# Altium footprint library HamedLib.PcbLib: 221 footprints (part 5 of 14)
Each footprint in its own frame and in the unit in brackets; x right, y up, seen from the top. Pads: shape width x height; smd on the part's side, far side on the other; paste and mask are expansions set on the pad; w line width, h text height; cw(c..) or ccw(c..) is an arc to the next point about the centre after c.
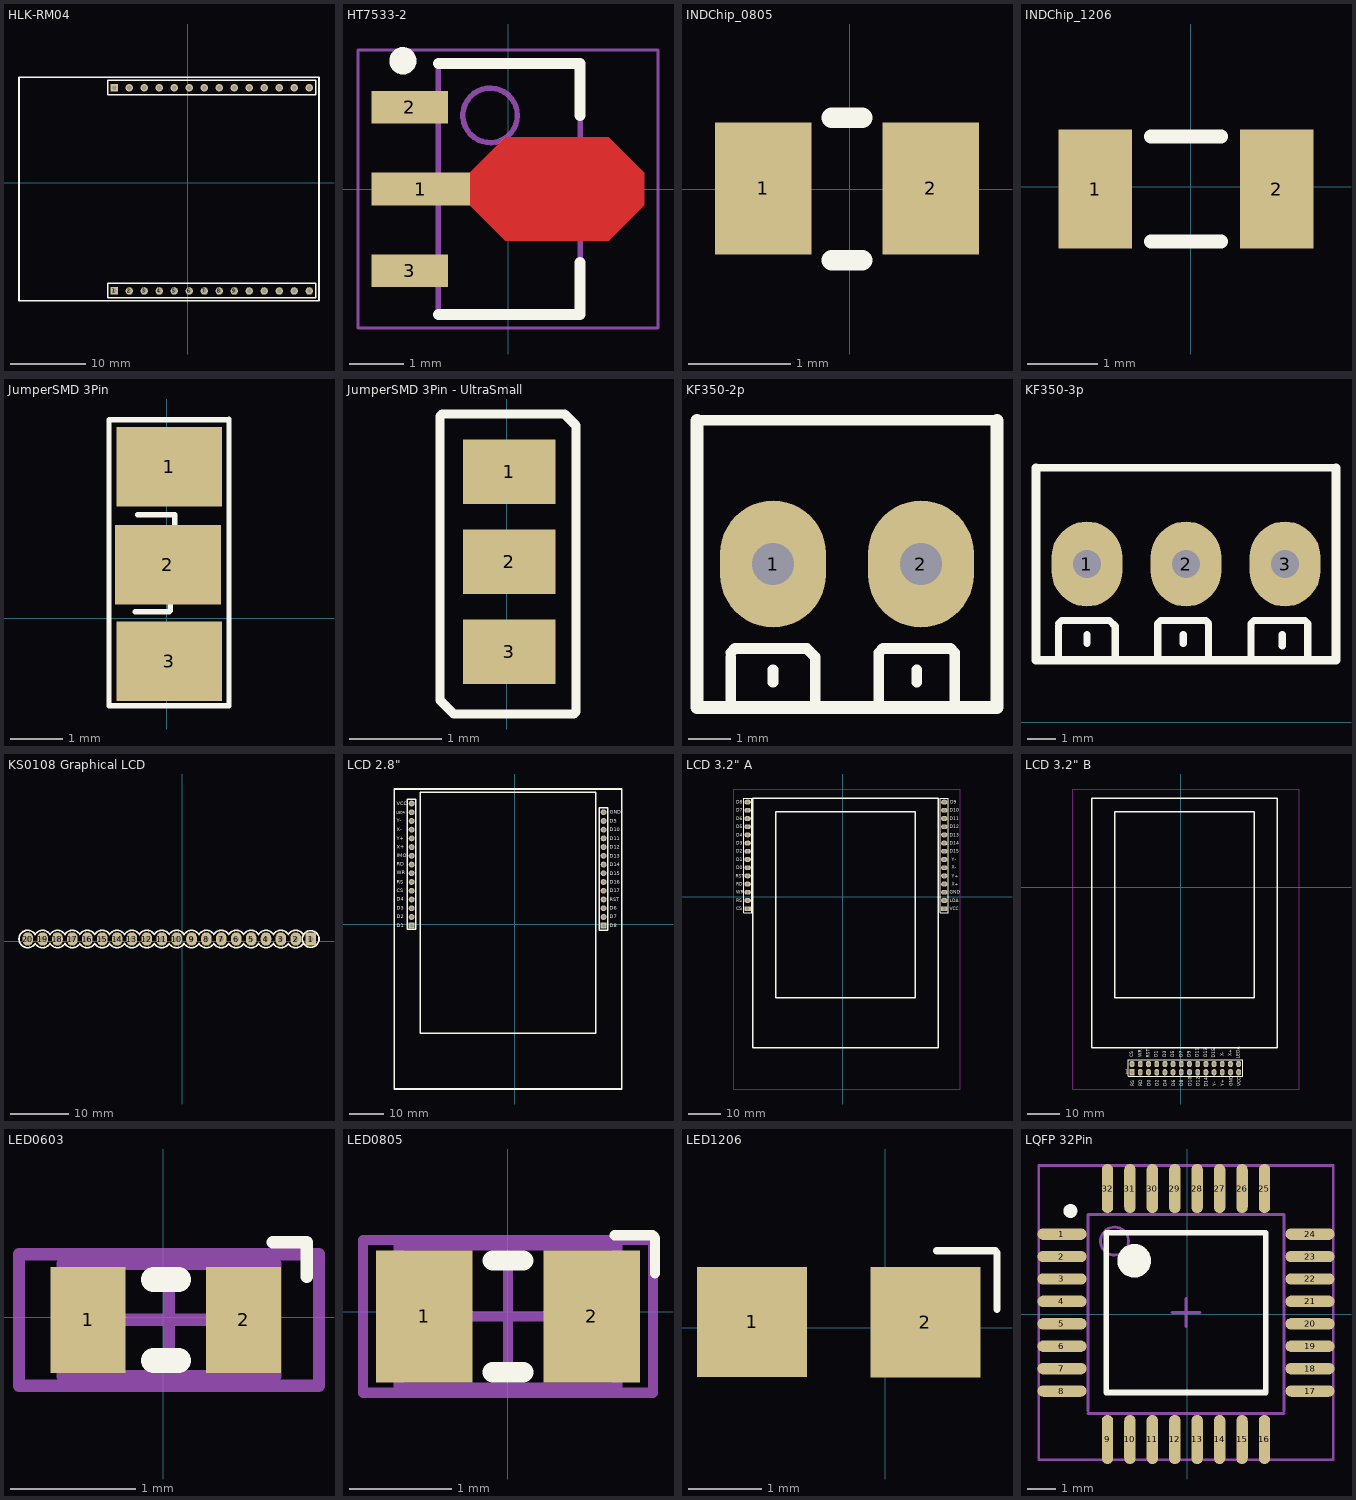
[diagram p4: the footprints below, top view; thin cyan lines are the x and y axes]

## HLK-RM04 [mm]
pads (28):
  rect 1x1 hole 0.6: 1(-9.827,-14.412) 28(-9.827,12.688)
  round 1 hole 0.6: 2(-7.827,-14.412) 3(-5.827,-14.412) 4(-3.827,-14.412) 5(-1.827,-14.412) 6(0.173,-14.412) 7(2.173,-14.412) 8(4.173,-14.412) 9(6.173,-14.412) 10(8.173,-14.412) 11(10.173,-14.412) 12(12.173,-14.412) 13(14.173,-14.412) 14(16.173,-14.412) 15(16.173,12.688) 16(14.173,12.688) 17(12.173,12.688) 18(10.173,12.688) 19(8.173,12.688) 20(6.173,12.688) 21(4.173,12.688) 22(2.173,12.688) 23(0.173,12.688) 24(-1.827,12.688) 25(-3.827,12.688) 26(-5.827,12.688) 27(-7.827,12.688)
Top Overlay:
  lines w0.2: -10.727,-15.312 -10.727,-13.412 17.073,-13.412 17.073,-15.312 -10.727,-15.312 ; -10.727,11.788 17.073,11.788 17.073,13.688 -10.727,13.688 -10.727,11.788
  lines w0.254: -22.527,-15.712 17.473,-15.712 17.473,14.088 -22.527,14.088 -22.527,-15.712
3D body "HLK RM04.STEP": height 5.5, standoff -5, extent -22.727,-15.512 17.273,13.788

## HT7533-2 [mm] "SOT89, 3-Leads, Body 4.49x2.45mm, Pitch 1.50mm, Lead Span 4.1mm, IPC Medium Density"
height 1.6
pads (3):
  rect 1.8x0.6 smd: 1(-1.6,0)
  rect 1.4x0.6 smd: 2(-1.8,1.5) 3(-1.8,-1.5)
Top Layer:
  region: -0.7,0.3 -0.05,0.95 1.85,0.95 2.5,0.3 2.5,-0.3 1.85,-0.95 -0.05,-0.95 -0.7,-0.3
Top Overlay:
  circle w0.25: c-1.927,2.35 r0.125
  lines w0.2: -1.278,-2.3 1.322,-2.3 1.322,-1.35 ; -1.278,2.3 1.322,2.3 1.322,1.35
Mechanical 13:
  circle w0.1: c-0.327,1.35 r0.5
  lines w0.1: -1.278,-2.3 1.322,-2.3 1.322,2.3 -1.278,2.3 -1.278,-2.3
Mechanical 15:
  lines w0.05: -2.75,-2.55 2.75,-2.55 2.75,2.55 -2.75,2.55 -2.75,-2.55
  lines w0.1: -0.477,0 0.523,0 ; 0.022,-0.5 0.022,0.5
3D body "HT7533-2.step": height 1.6, standoff 0, extent -2.2,-2.3 1.85,2.3

## INDChip_0805 [mm]
pads (2):
  rect 0.95x1.3 smd: 1(-0.852,0.005) 2(0.798,0.005)
Top Overlay:
  lines w0.2: -0.175,-0.7 0.125,-0.7 ; -0.175,0.7 0.125,0.7
3D body "User Library-ind_0805.step": height 0.95, standoff 0, extent -0.975,-0.625 1.025,0.575

## INDChip_1206 [mm]
pads (2):
  rect 1.05x1.7 smd: 1(-1.369,-0.03) 2(1.227,-0.03)
Top Overlay:
  lines w0.2: -0.571,-0.78 0.429,-0.78 ; -0.571,0.72 0.429,0.72
3D body "User Library-V1206HD.STEP": height 1.5, standoff 0, extent -1.725,-0.8 1.475,0.8

## JumperSMD 3Pin [mm]
pads (3):
  rect 2x1.5 smd: 1(0.051,2.87) 2(0.025,1.016) 3(0.051,-0.813)
Top Overlay:
  lines w0.1: -1.09,3.76 1.18,3.76 ; -1.09,3.765 -1.09,-1.655 1.18,-1.655 ; -0.625,-0.145 0.08,-0.145 0.08,-0.52 ; -0.6,0.125 0.05,0.125 0.07,0.145 0.07,0.525 ; -0.55,1.96 0.155,1.96 0.155,1.585 ; -0.525,2.23 0.125,2.23 0.145,2.25 0.145,2.63 ; 1.18,-1.635 1.18,3.77

## JumperSMD 3Pin - UltraSmall [mm]
pads (3):
  rect 1x0.7 smd: 1(0.025,2.875) 2(0.025,1.9) 3(0.025,0.925)
Top Overlay:
  lines w0.1: -0.725,0.4 -0.575,0.25 0.725,0.25 0.75,0.275 0.75,3.375 0.625,3.5 -0.7,3.5 -0.725,3.475 -0.725,0.4

## KF350-2p [mm] "-"
pads (2):
  oval 2.5x3 hole 1: 1(-10.1,5.6) 2(-6.6,5.6)
Top Overlay:
  lines w0.254: -11.9,9 -4.8,9 ; -11.1,2.2 -11.1,3.4 ; -11.1,3.5 -11,3.6 -9.3,3.6 -9.1,3.4 -9.1,2.3 ; -10.1,2.8 -10.1,3.1 ; -7.6,2.3 -7.6,3.5 -7.5,3.6 -5.9,3.6 -5.8,3.5 -5.8,2.2 ; -6.7,2.8 -6.7,3.1
  lines w0.305: -11.9,9 -11.9,2.2 -4.8,2.2 -4.8,9
3D body "User Library-KF350-2P.STEP": height 8.8, standoff -2.6, extent -11.9,2.1 -4.9,9

## KF350-3p [mm] "-"
pads (3):
  oval 2.5x3 hole 1: 1(-10.1,5.6) 2(-6.6,5.6) 3(-3.1,5.6)
Top Overlay:
  lines w0.254: -11.9,9 -1.3,9 ; -11.1,2.2 -11.1,3.4 ; -11.1,3.5 -11,3.6 -9.3,3.6 -9.1,3.4 -9.1,2.3 ; -10.1,2.8 -10.1,3.1 ; -7.6,2.3 -7.6,3.5 -7.5,3.6 -5.9,3.6 -5.8,3.5 -5.8,2.2 ; -6.7,2.8 -6.7,3.1 ; -4.3,2.3 -4.3,3.5 -4.2,3.6 -2.4,3.6 -2.3,3.5 -2.3,2.2 ; -3.2,2.7 -3.2,3.1
  lines w0.305: -11.9,9 -11.9,2.2 -1.3,2.2 -1.3,9
3D body "User Library-KF350-3P.STEP": height 8.8, standoff -2.6, extent -11.9,2.1 -1.4,9

## KS0108 Graphical LCD [mm] "-"
pads (20):
  rect 1.8x2.3 hole 0.9: 1(21.885,0.42)
  oval 1.8x2.3 hole 0.9: 2(19.345,0.42) 3(16.805,0.42) 4(14.265,0.42) 5(11.725,0.42) 6(9.185,0.42) 7(6.645,0.42) 8(4.105,0.42) 9(1.565,0.42) 10(-0.975,0.42) 11(-3.515,0.42) 12(-6.055,0.42) 13(-8.595,0.42) 14(-11.135,0.42) 15(-13.675,0.42) 16(-16.215,0.42) 17(-18.755,0.42) 18(-21.295,0.42) 19(-23.835,0.42) 20(-26.375,0.42)
Top Overlay:
  circle w0.3: c21.885,0.42 r1.42
  lines w0.3: -25.119,1.205 ccw(c-26.375,0.42) -25.105,-0.342 ccw(c-23.835,0.42) -22.565,-0.342 ccw(c-21.295,0.42) -20.025,-0.342 ccw(c-18.755,0.42) -17.485,-0.342 ccw(c-16.215,0.42) -14.945,-0.342 ccw(c-13.675,0.42) -12.405,-0.342 ccw(c-11.135,0.42) -9.865,-0.342 ccw(c-8.595,0.42) -7.325,-0.342 ccw(c-6.055,0.42) -4.785,-0.342 ccw(c-3.515,0.42) -2.245,-0.342 ccw(c-0.975,0.42) 0.295,-0.342 ccw(c1.565,0.42) 2.835,-0.342 ccw(c4.105,0.42) 5.375,-0.342 ccw(c6.645,0.42) 7.915,-0.342 ccw(c9.185,0.42) 10.455,-0.342 ccw(c11.725,0.42) 12.995,-0.342 ccw(c14.265,0.42) 15.535,-0.342 ccw(c16.805,0.42) 18.075,-0.342 ccw(c19.345,0.42) 20.615,-0.342 ; -25.105,1.182 cw(c-23.835,0.42) -22.565,1.182 cw(c-21.295,0.42) -20.025,1.182 cw(c-18.755,0.42) -17.485,1.182 cw(c-16.215,0.42) -14.945,1.182 cw(c-13.675,0.42) -12.405,1.182 cw(c-11.135,0.42) -9.865,1.182 cw(c-8.595,0.42) -7.325,1.182 cw(c-6.055,0.42) -4.785,1.182 cw(c-3.515,0.42) -2.245,1.182 cw(c-0.975,0.42) 0.295,1.182 cw(c1.565,0.42) 2.835,1.182 cw(c4.105,0.42) 5.375,1.182 cw(c6.645,0.42) 7.915,1.182 cw(c9.185,0.42) 10.455,1.182 cw(c11.725,0.42) 12.995,1.182 cw(c14.265,0.42) 15.535,1.182 cw(c16.805,0.42) 18.075,1.182 cw(c19.345,0.42) 20.615,1.182
3D body "KS0801 LCD 64x128.STEP": height 12.5, standoff -8.5, extent -39.475,-2.25 53.525,67.75

## LCD 2.8" [mm]
pads (29):
  round 1.7 hole 1: 1(-30.067,35.178) 2(-30.067,32.638) 3(-30.067,30.098) 4(-30.067,27.558) 5(-30.067,25.018) 6(-30.067,22.478) 7(-30.067,19.938) 8(-30.067,17.398) 9(-30.067,14.858) 10(-30.067,12.318) 11(-30.067,9.778) 12(-30.067,7.238) 13(-30.067,4.698) 14(-30.067,2.158) 16(25.813,32.638) 17(25.813,30.098) 18(25.813,27.558) 19(25.813,25.018) 20(25.813,22.478) 21(25.813,19.938) 22(25.813,17.398) 23(25.813,14.858) 24(25.813,12.318) 25(25.813,9.778) 26(25.813,7.238) 27(25.813,4.698) 28(25.813,2.158)
  rect 1.7x1.7 hole 1: 15(-30.067,-0.382) 29(25.813,-0.382)
Top Overlay:
  lines w0.4: -31.337,-1.474 -28.797,-1.474 -28.797,36.448 -31.337,36.448 -31.337,0.253 -31.337,-1.474 ; -27.5,-31.73 -27.5,38.47 23.5,38.47 23.5,-31.73 -22.5,-31.73 -27.5,-31.73 ; 24.543,-1.652 27.083,-1.652 27.083,33.908 24.543,33.908 24.543,0.253 24.543,-1.652
  lines w0.508: -35.096,-47.931 -35.096,39.395 31.071,39.395 31.071,-47.931 -35.096,-47.931
  text "D8" at 27.591,-0.839 h1.02
  text "D7" at 27.591,1.726 h1.02
  text "D6" at 27.591,4.266 h1.02
  text "RST" at 27.591,6.705 h1.02
  text "D17" at 27.591,9.296 h1.02
  text "D16" at 27.591,11.81 h1.02
  text "D15" at 27.591,14.35 h1.02
  text "D14" at 27.591,16.89 h1.02
  text "D13" at 27.591,19.43 h1.02
  text "D12" at 27.591,21.97 h1.02
  text "D11" at 27.591,24.536 h1.02
  text "D10" at 27.591,27.05 h1.02
  text "GND" at 27.591,32.206 h1.02
  text "VCC" at -34.41,34.594 h1.02
  text "Y-" at -34.41,29.717 h1.02
  text "X-" at -34.41,27.05 h1.02
  text "Y+" at -34.41,24.51 h1.02
  text "X+" at -34.41,22.046 h1.02
  text "RD" at -34.41,17.043 h1.02
  text "WR" at -34.41,14.604 h1.02
  text "RS" at -34.41,11.886 h1.02
  text "CS" at -34.41,9.346 h1.02
  text "D4" at -34.41,6.883 h1.02
  text "D3" at -34.41,4.216 h1.02
  text "D2" at -34.41,1.726 h1.02
  text "D1" at -34.41,-0.814 h1.02
  text "IMO" at -34.41,19.456 h1.02
  text "D5" at 27.591,29.641 h1.02
  text "LEDA" at -34.537,32.206 h0.78

## LCD 3.2" A [mm]
pads (28):
  oval 2x1.5 hole 1: 1(-29.509,29.308) 2(-29.509,26.768) 3(-29.509,24.228) 4(-29.509,21.688) 5(-29.509,19.148) 6(-29.509,16.608) 7(-29.509,14.068) 8(-29.509,11.528) 9(-29.509,8.988) 10(-29.509,6.448) 11(-29.509,3.908) 12(-29.509,1.368) 13(-29.509,-1.172) 15(31.451,29.308) 16(31.451,26.768) 17(31.451,24.228) 18(31.451,21.688) 19(31.451,19.148) 20(31.451,16.608) 21(31.451,14.068) 22(31.451,11.528) 23(31.451,8.988) 24(31.451,6.448) 25(31.451,3.908) 26(31.451,1.368) 27(31.451,-1.172)
  rect 2x1.5 hole 1: 14(-29.509,-3.712) 28(31.451,-3.712)
Top Overlay:
  lines w0.2: -30.779,-4.982 -30.779,-3.077 -30.779,30.578 -28.239,30.578 -28.239,-4.982 -30.779,-4.982 ; 30.181,-4.982 30.181,-3.077 30.181,30.578 32.721,30.578 32.721,-4.982 30.181,-4.982
  lines w0.4: -27.856,-46.78 -27.856,30.441 29.544,30.441 29.544,-46.78 -27.856,-46.78 ; -20.756,-31.259 -20.756,26.341 22.444,26.341 22.444,-31.259 -20.756,-31.259
  text "D8" at -33.065,28.8 h1.02
  text "D7" at -33.065,26.26 h1.02
  text "D6" at -33.065,23.72 h1.02
  text "D5" at -33.065,21.18 h1.02
  text "D4" at -33.065,18.64 h1.02
  text "D3" at -33.065,16.1 h1.02
  text "D2" at -33.065,13.56 h1.02
  text "D1" at -33.065,11.02 h1.02
  text "D0" at -33.065,8.48 h1.02
  text "RST" at -33.192,5.94 h1.02
  text "RD" at -33.065,3.4 h1.02
  text "WR" at -33.065,0.86 h1.02
  text "RS" at -33.065,-1.68 h1.02
  text "CS" at -33.065,-4.22 h1.02
  text "VCC" at 33.102,-4.22 h1.02
  text "LDA" at 33.102,-1.68 h1.02
  text "GND" at 33.102,0.86 h1.02
  text "X+" at 33.737,3.4 h1.02
  text "Y+" at 33.737,5.94 h1.02
  text "X-" at 33.737,8.607 h1.02
  text "Y-" at 33.737,11.02 h1.02
  text "D15" at 33.102,13.56 h1.02
  text "D14" at 33.102,16.1 h1.02
  text "D13" at 33.102,18.64 h1.02
  text "D12" at 33.102,21.18 h1.02
  text "D11" at 33.102,23.72 h1.02
  text "D10" at 33.102,26.26 h1.02
  text "D9" at 33.229,28.8 h1.02
Keep-Out Layer:
  lines w0.254: -33.827,-59.592 -33.827,33.372 36.404,33.372 36.404,-59.592 -33.827,-59.592

## LCD 3.2" B [mm]
pads (28):
  oval 1.5x2 hole 1: 1(0.091,-57.283) 2(0.091,-54.743) 3(-2.449,-57.283) 4(-2.449,-54.743) 5(-4.989,-57.283) 6(-4.989,-54.743) 7(-7.529,-57.283) 8(-7.529,-54.743) 9(-10.069,-57.283) 10(-10.069,-54.743) 11(-12.609,-57.283) 12(-12.609,-54.743) 14(-15.149,-54.743) 15(2.631,-54.743) 16(2.631,-57.283) 17(5.171,-54.743) 18(5.171,-57.283) 19(7.711,-54.743) 20(7.711,-57.283) 21(10.251,-54.743) 22(10.251,-57.283) 23(12.791,-54.743) 24(12.791,-57.283) 25(15.331,-54.743) 26(15.331,-57.283) 27(17.871,-54.743) 28(17.871,-57.283)
  rect 1.5x2 hole 1: 13(-15.149,-57.283)
Top Overlay:
  lines w0.2: -16.419,-58.553 19.141,-58.553 19.141,-53.473 -16.419,-53.473 -16.419,-58.553
  lines w0.4: -27.593,-49.678 -27.593,27.543 29.807,27.543 29.807,-49.678 -27.593,-49.678 ; -20.493,-34.157 -20.493,23.443 22.707,23.443 22.707,-34.157 -20.493,-34.157
  text "VCC" at 18.506,-61.601 h1.02
  text "GND" at 15.966,-61.601 h1.02
  text "Y+" at 13.426,-61.601 h1.02
  text "Y-" at 10.886,-61.601 h1.02
  text "D14" at 8.346,-61.728 h1.02
  text "D12" at 5.806,-61.601 h1.02
  text "D10" at 3.266,-61.601 h1.02
  text "D8" at 0.726,-61.601 h1.02
  text "D6" at -1.814,-61.601 h1.02
  text "D4" at -4.354,-61.601 h1.02
  text "D2" at -6.894,-61.601 h1.02
  text "D0" at -9.434,-61.601 h1.02
  text "RD" at -11.974,-61.601 h1.02
  text "RS" at -14.514,-61.601 h1.02
  text "LEDA" at 18.252,-53.092 h1.02
  text "X+" at 15.712,-52.33 h1.02
  text "X-" at 13.172,-52.33 h1.02
  text "D15" at 10.632,-52.838 h1.02
  text "D13" at 8.092,-52.711 h1.02
  text "D11" at 5.552,-52.711 h1.02
  text "D9" at 3.012,-52.584 h1.02
  text "D7" at 0.472,-52.584 h1.02
  text "D5" at -2.068,-52.584 h1.02
  text "D3" at -4.608,-52.584 h1.02
  text "D1" at -7.148,-52.584 h1.02
  text "RST" at -9.688,-52.838 h1.02
  text "WR" at -12.228,-52.584 h1.02
  text "CS" at -14.768,-52.584 h1.02
  text "1" at -17.308,-57.791 h1.27
Keep-Out Layer:
  lines w0.254: -33.564,-62.49 -33.564,30.474 36.667,30.474 36.667,-62.49 -33.564,-62.49

## LED0603 [mm]
height 1
pads (2):
  rect 0.6x0.85 smd: 1(-0.6,-0.021) 2(0.644,-0.021)
Top Overlay:
  lines w0.1: 0.875,0.6 1.15,0.6 1.15,0.325
  lines w0.2: -0.078,-0.346 0.122,-0.346 ; -0.078,0.304 0.122,0.304
Mechanical 13:
  lines w0.1: -0.803,-0.471 -0.803,0.429 0.897,0.429 0.897,-0.471 -0.803,-0.471
Mechanical 15:
  lines w0.1: -0.403,-0.021 0.497,-0.021 ; 0.047,-0.471 0.047,0.429 ; -1.153,-0.546 -1.153,0.504 1.247,0.504 1.247,-0.546 -1.153,-0.546
3D body "LED 0603.STEP": height 0.9, standoff 0, extent -0.825,-0.475 0.875,0.425

## LED0805 [mm]
height 1.5
pads (2):
  rect 0.95x1.3 smd: 1(-0.822,-0.047) 2(0.828,-0.047)
Top Overlay:
  lines w0.1: 1.05,0.75 1.425,0.75 1.45,0.725 1.45,0.375
  lines w0.2: -0.147,-0.597 0.153,-0.597 ; -0.147,0.503 0.153,0.503
Mechanical 13:
  lines w0.1: -1.072,-0.747 1.078,-0.747 1.078,0.653 -1.072,0.653 -1.072,-0.747
Mechanical 15:
  lines w0.1: -0.497,-0.047 0.503,-0.047 ; 0.003,-0.547 0.003,0.453 ; -1.422,-0.797 1.428,-0.797 1.428,0.703 -1.422,0.703 -1.422,-0.797
3D body "LED 0805.STEP": height 1.1, standoff 0, extent -1.035,-0.675 0.985,0.575

## LED1206 [mm]
height 2
pads (2):
  rect 1.5x1.5 smd: 1(-1.814,0.08) 2(0.55,0.075)
Top Overlay:
  lines w0.1: 0.7,1.05 1.5,1.05 1.525,1.025 1.525,0.25
3D body "LED 1206.step": height 1.1, standoff 0, extent -2.25,-0.725 0.95,0.875

## LQFP 32Pin [mil] "Low Profile 32pin Quad FLat Pack Package"
pads (32):
  oval 69x16 smd: 1(-175.82,112.72) 2(-175.82,81.22) 3(-175.82,49.72) 4(-175.82,18.23) 5(-175.82,-13.27) 6(-175.82,-44.76) 7(-175.82,-76.26) 8(-175.82,-107.76) 17(172.61,-107.76) 18(172.61,-76.26) 19(172.61,-44.76) 20(172.61,-13.27) 21(172.61,18.23) 22(172.61,49.72) 23(172.61,81.22) 24(172.61,112.72)
  oval 16x69 smd: 9(-111.84,-175.67) 10(-80.35,-175.67) 11(-48.85,-175.67) 12(-17.35,-175.67) 13(14.14,-175.67) 14(45.64,-175.67) 15(77.13,-175.67) 16(108.63,-175.67) 25(108.63,176.69) 26(77.13,176.69) 27(45.64,176.69) 28(14.14,176.69) 29(-17.35,176.69) 30(-48.85,176.69) 31(-80.35,176.69) 32(-111.84,176.69)
Top Overlay:
  circle w9.84: c-164.01,145.2 r4.92
  circle w23.62: c-74.44,75.31 r11.81
  lines w7.87: -113.81,-109.72 -113.81,114.69 110.6,114.69 110.6,-109.72 -113.81,-109.72
Mechanical 13:
  circle w3.94: c-102,102.87 r19.68
  lines w3.94: -139.4,-139.25 136.19,-139.25 ; -139.4,-135.31 -139.4,140.28 136.19,140.28 136.19,-135.31
Mechanical 15:
  lines w3.94: -21.29,2.48 18.08,2.48 ; -1.61,-17.2 -1.61,22.17 ; -208.3,-204.21 -208.3,209.17 205.09,209.17 205.09,-204.21 -208.3,-204.21
3D body "User Library-lqfp32-1.step": height 59.06, standoff 0.79, extent -177.16,-173.22 177.17,181.11